# Altium schematic symbol library altera.SCHLIB: 68 symbols (part 1 of 6)
Pins are listed as number, name and electrical type; pins without a type are passive.

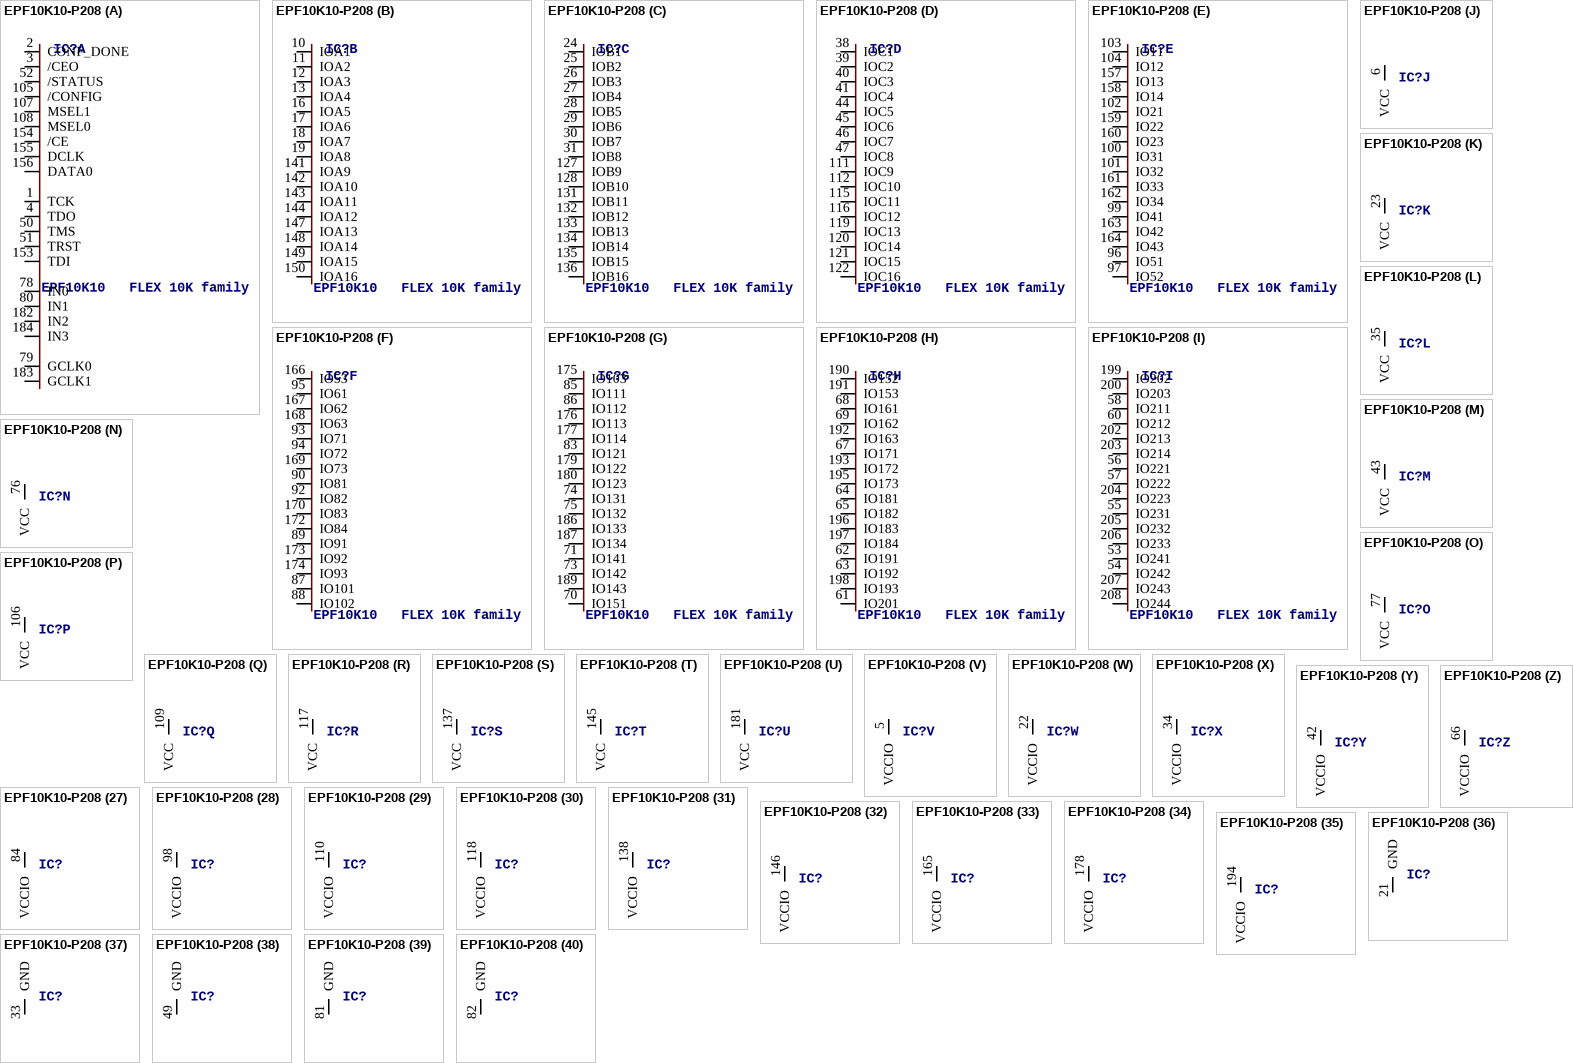
[diagram p0: symbol EPF10K10-P208]

## EPF10K10-P208
designator IC?, comment EPF10K10   FLEX 10K family
MPN: EPF10K10AQC208-3N; OC_FARNELL: 1549381; OC_NEWARK: 51R8749
footprint PQFP208
part A pins: 1 TCK, 2 CONF_DONE, 3 /CEO, 4 TDO, 50 TMS, 51 TRST, 52 /STATUS, 78 IN0, 79 GCLK0, 80 IN1, 105 /CONFIG, 107 MSEL1, 108 MSEL0, 153 TDI, 154 /CE, 155 DCLK, 156 DATA0, 182 IN2, 183 GCLK1, 184 IN3
part B pins: 10 IOA1, 11 IOA2, 12 IOA3, 13 IOA4, 16 IOA5, 17 IOA6, 18 IOA7, 19 IOA8, 141 IOA9, 142 IOA10, 143 IOA11, 144 IOA12, 147 IOA13, 148 IOA14, 149 IOA15, 150 IOA16
part C pins: 24 IOB1, 25 IOB2, 26 IOB3, 27 IOB4, 28 IOB5, 29 IOB6, 30 IOB7, 31 IOB8, 127 IOB9, 128 IOB10, 131 IOB11, 132 IOB12, 133 IOB13, 134 IOB14, 135 IOB15, 136 IOB16
part D pins: 38 IOC1, 39 IOC2, 40 IOC3, 41 IOC4, 44 IOC5, 45 IOC6, 46 IOC7, 47 IOC8, 111 IOC9, 112 IOC10, 115 IOC11, 116 IOC12, 119 IOC13, 120 IOC14, 121 IOC15, 122 IOC16
part E pins: 96 IO51, 97 IO52, 99 IO41, 100 IO31, 101 IO32, 102 IO21, 103 IO11, 104 IO12, 157 IO13, 158 IO14, 159 IO22, 160 IO23, 161 IO33, 162 IO34, 163 IO42, 164 IO43
part F pins: 87 IO101, 88 IO102, 89 IO91, 90 IO81, 92 IO82, 93 IO71, 94 IO72, 95 IO61, 166 IO53, 167 IO62, 168 IO63, 169 IO73, 170 IO83, 172 IO84, 173 IO92, 174 IO93
part G pins: 70 IO151, 71 IO141, 73 IO142, 74 IO131, 75 IO132, 83 IO121, 85 IO111, 86 IO112, 175 IO103, 176 IO113, 177 IO114, 179 IO122, 180 IO123, 186 IO133, 187 IO134, 189 IO143
part H pins: 61 IO201, 62 IO191, 63 IO192, 64 IO181, 65 IO182, 67 IO171, 68 IO161, 69 IO162, 190 IO152, 191 IO153, 192 IO163, 193 IO172, 195 IO173, 196 IO183, 197 IO184, 198 IO193
part I pins: 53 IO241, 54 IO242, 55 IO231, 56 IO221, 57 IO222, 58 IO211, 60 IO212, 199 IO202, 200 IO203, 202 IO213, 203 IO214, 204 IO223, 205 IO232, 206 IO233, 207 IO243, 208 IO244
part J pins: 6 VCC (power)
part K pins: 23 VCC (power)
part L pins: 35 VCC (power)
part M pins: 43 VCC (power)
part N pins: 76 VCC (power)
part O pins: 77 VCC (power)
part P pins: 106 VCC (power)
part Q pins: 109 VCC (power)
part R pins: 117 VCC (power)
part S pins: 137 VCC (power)
part T pins: 145 VCC (power)
part U pins: 181 VCC (power)
part V pins: 5 VCCIO (power)
part W pins: 22 VCCIO (power)
part X pins: 34 VCCIO (power)
part Y pins: 42 VCCIO (power)
part Z pins: 66 VCCIO (power)
part 27 pins: 84 VCCIO (power)
part 28 pins: 98 VCCIO (power)
part 29 pins: 110 VCCIO (power)
part 30 pins: 118 VCCIO (power)
part 31 pins: 138 VCCIO (power)
part 32 pins: 146 VCCIO (power)
part 33 pins: 165 VCCIO (power)
part 34 pins: 178 VCCIO (power)
part 35 pins: 194 VCCIO (power)
part 36 pins: 21 GND (power)
part 37 pins: 33 GND (power)
part 38 pins: 49 GND (power)
part 39 pins: 81 GND (power)
part 40 pins: 82 GND (power)
part 41 pins: 123 GND (power)
part 42 pins: 129 GND (power)
part 43 pins: 151 GND (power)
part 44 pins: 185 GND (power)
part 45 pins: 20 GNDIO (power)
part 46 pins: 32 GNDIO (power)
part 47 pins: 48 GNDIO (power)
part 48 pins: 59 GNDIO (power)
part 49 pins: 72 GNDIO (power)
part 50 pins: 91 GNDIO (power)
part 51 pins: 124 GNDIO (power)
part 52 pins: 130 GNDIO (power)
part 53 pins: 152 GNDIO (power)
part 54 pins: 171 GNDIO (power)
part 55 pins: 188 GNDIO (power)
part 56 pins: 201 GNDIO (power)
part 57 pins: 7 NC
part 58 pins: 8 NC
part 59 pins: 9 NC
part 60 pins: 14 NC
part 61 pins: 15 NC
part 62 pins: 36 NC
part 63 pins: 37 NC
part 64 pins: 113 NC
part 65 pins: 114 NC
part 66 pins: 125 NC
part 67 pins: 126 NC
part 68 pins: 139 NC
part 69 pins: 140 NC

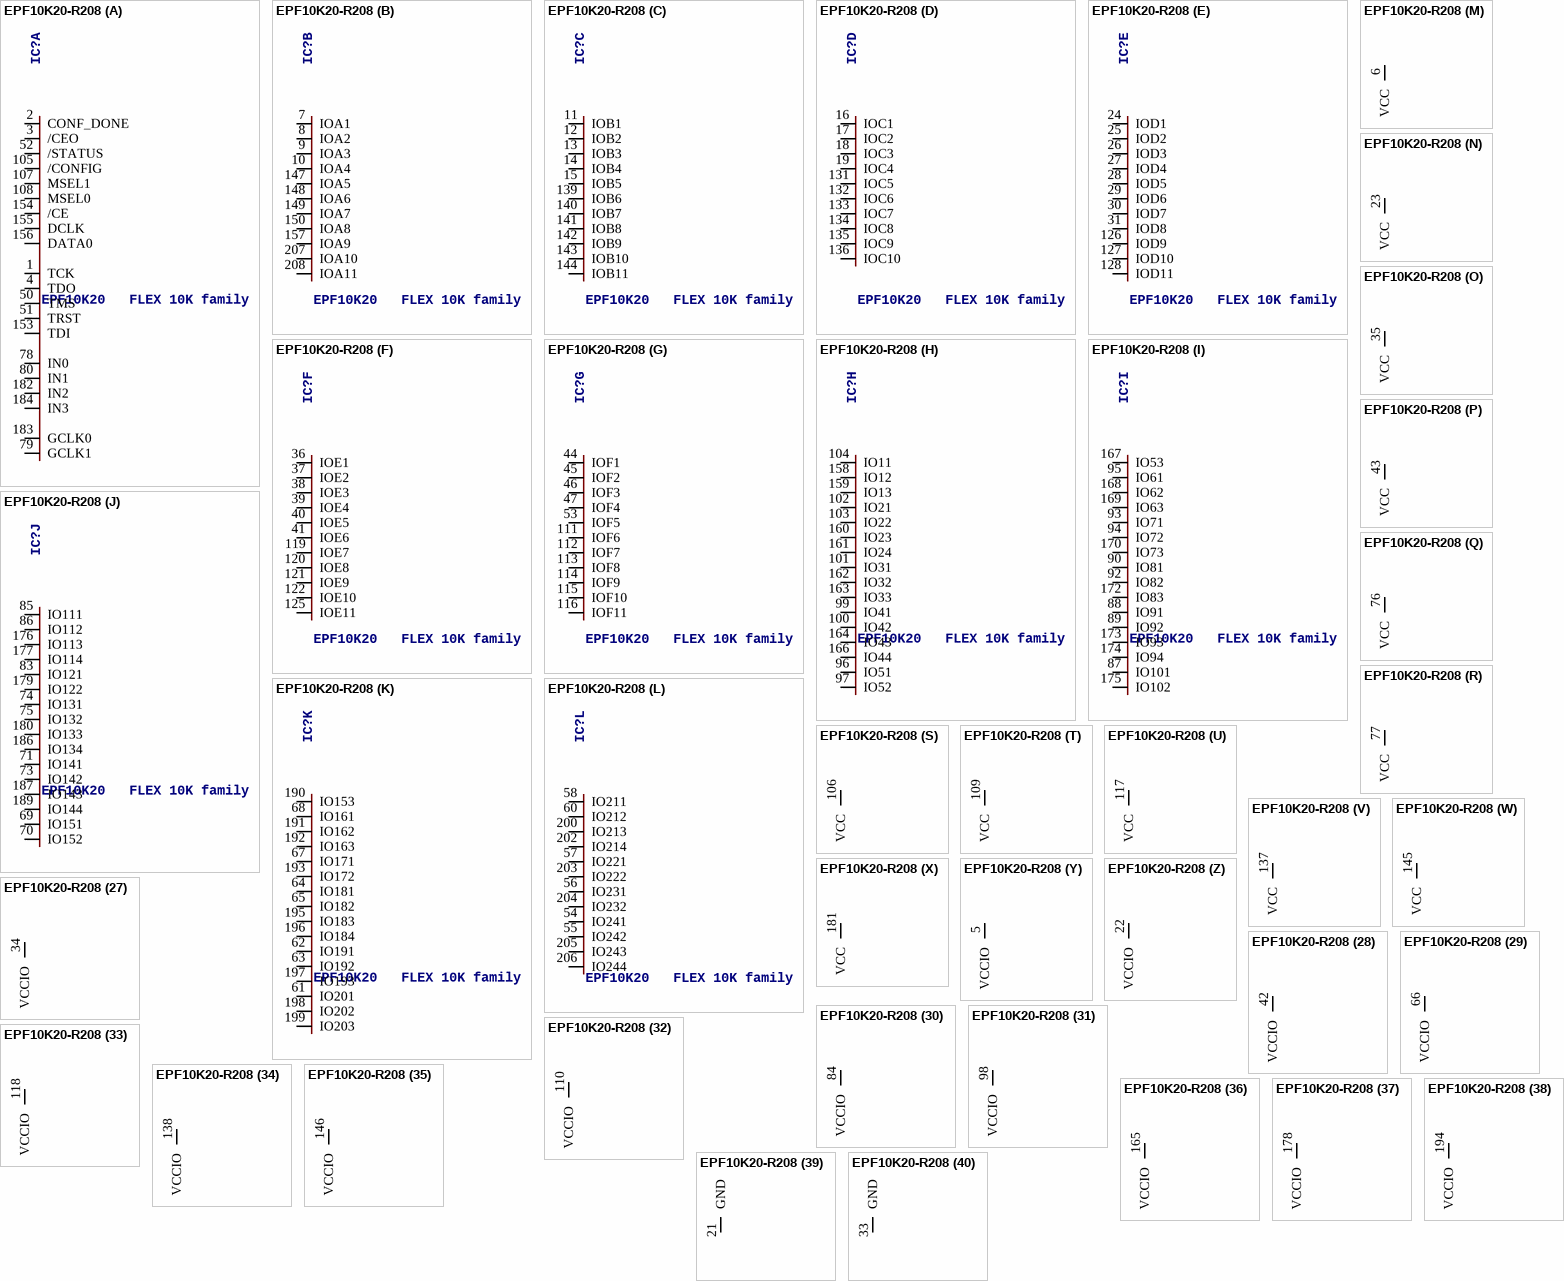
[diagram p1: symbol EPF10K20-R208]

## EPF10K20-R208
designator IC?, comment EPF10K20   FLEX 10K family
MPN: EPF10K20RC208-3N; OC_FARNELL: 1549383; OC_NEWARK: 51R8880
footprint RQFP208
part A pins: 1 TCK, 2 CONF_DONE, 3 /CEO, 4 TDO, 50 TMS, 51 TRST, 52 /STATUS, 78 IN0, 79 GCLK1, 80 IN1, 105 /CONFIG, 107 MSEL1, 108 MSEL0, 153 TDI, 154 /CE, 155 DCLK, 156 DATA0, 182 IN2, 183 GCLK0, 184 IN3
part B pins: 7 IOA1, 8 IOA2, 9 IOA3, 10 IOA4, 147 IOA5, 148 IOA6, 149 IOA7, 150 IOA8, 157 IOA9, 207 IOA10, 208 IOA11
part C pins: 11 IOB1, 12 IOB2, 13 IOB3, 14 IOB4, 15 IOB5, 139 IOB6, 140 IOB7, 141 IOB8, 142 IOB9, 143 IOB10, 144 IOB11
part D pins: 16 IOC1, 17 IOC2, 18 IOC3, 19 IOC4, 131 IOC5, 132 IOC6, 133 IOC7, 134 IOC8, 135 IOC9, 136 IOC10
part E pins: 24 IOD1, 25 IOD2, 26 IOD3, 27 IOD4, 28 IOD5, 29 IOD6, 30 IOD7, 31 IOD8, 126 IOD9, 127 IOD10, 128 IOD11
part F pins: 36 IOE1, 37 IOE2, 38 IOE3, 39 IOE4, 40 IOE5, 41 IOE6, 119 IOE7, 120 IOE8, 121 IOE9, 122 IOE10, 125 IOE11
part G pins: 44 IOF1, 45 IOF2, 46 IOF3, 47 IOF4, 53 IOF5, 111 IOF6, 112 IOF7, 113 IOF8, 114 IOF9, 115 IOF10, 116 IOF11
part H pins: 96 IO51, 97 IO52, 99 IO41, 100 IO42, 101 IO31, 102 IO21, 103 IO22, 104 IO11, 158 IO12, 159 IO13, 160 IO23, 161 IO24, 162 IO32, 163 IO33, 164 IO43, 166 IO44
part I pins: 87 IO101, 88 IO91, 89 IO92, 90 IO81, 92 IO82, 93 IO71, 94 IO72, 95 IO61, 167 IO53, 168 IO62, 169 IO63, 170 IO73, 172 IO83, 173 IO93, 174 IO94, 175 IO102
part J pins: 69 IO151, 70 IO152, 71 IO141, 73 IO142, 74 IO131, 75 IO132, 83 IO121, 85 IO111, 86 IO112, 176 IO113, 177 IO114, 179 IO122, 180 IO133, 186 IO134, 187 IO143, 189 IO144
part K pins: 61 IO201, 62 IO191, 63 IO192, 64 IO181, 65 IO182, 67 IO171, 68 IO161, 190 IO153, 191 IO162, 192 IO163, 193 IO172, 195 IO183, 196 IO184, 197 IO193, 198 IO202, 199 IO203
part L pins: 54 IO241, 55 IO242, 56 IO231, 57 IO221, 58 IO211, 60 IO212, 200 IO213, 202 IO214, 203 IO222, 204 IO232, 205 IO243, 206 IO244
part M pins: 6 VCC (power)
part N pins: 23 VCC (power)
part O pins: 35 VCC (power)
part P pins: 43 VCC (power)
part Q pins: 76 VCC (power)
part R pins: 77 VCC (power)
part S pins: 106 VCC (power)
part T pins: 109 VCC (power)
part U pins: 117 VCC (power)
part V pins: 137 VCC (power)
part W pins: 145 VCC (power)
part X pins: 181 VCC (power)
part Y pins: 5 VCCIO (power)
part Z pins: 22 VCCIO (power)
part 27 pins: 34 VCCIO (power)
part 28 pins: 42 VCCIO (power)
part 29 pins: 66 VCCIO (power)
part 30 pins: 84 VCCIO (power)
part 31 pins: 98 VCCIO (power)
part 32 pins: 110 VCCIO (power)
part 33 pins: 118 VCCIO (power)
part 34 pins: 138 VCCIO (power)
part 35 pins: 146 VCCIO (power)
part 36 pins: 165 VCCIO (power)
part 37 pins: 178 VCCIO (power)
part 38 pins: 194 VCCIO (power)
part 39 pins: 21 GND (power)
part 40 pins: 33 GND (power)
part 41 pins: 49 GND (power)
part 42 pins: 81 GND (power)
part 43 pins: 82 GND (power)
part 44 pins: 123 GND (power)
part 45 pins: 129 GND (power)
part 46 pins: 151 GND (power)
part 47 pins: 185 GND (power)
part 48 pins: 20 GNDIO (power)
part 49 pins: 32 GNDIO (power)
part 50 pins: 48 GNDIO (power)
part 51 pins: 59 GNDIO (power)
part 52 pins: 72 GNDIO (power)
part 53 pins: 91 GNDIO (power)
part 54 pins: 124 GNDIO (power)
part 55 pins: 130 GNDIO (power)
part 56 pins: 152 GNDIO (power)
part 57 pins: 171 GNDIO (power)
part 58 pins: 188 GNDIO (power)
part 59 pins: 201 GNDIO (power)

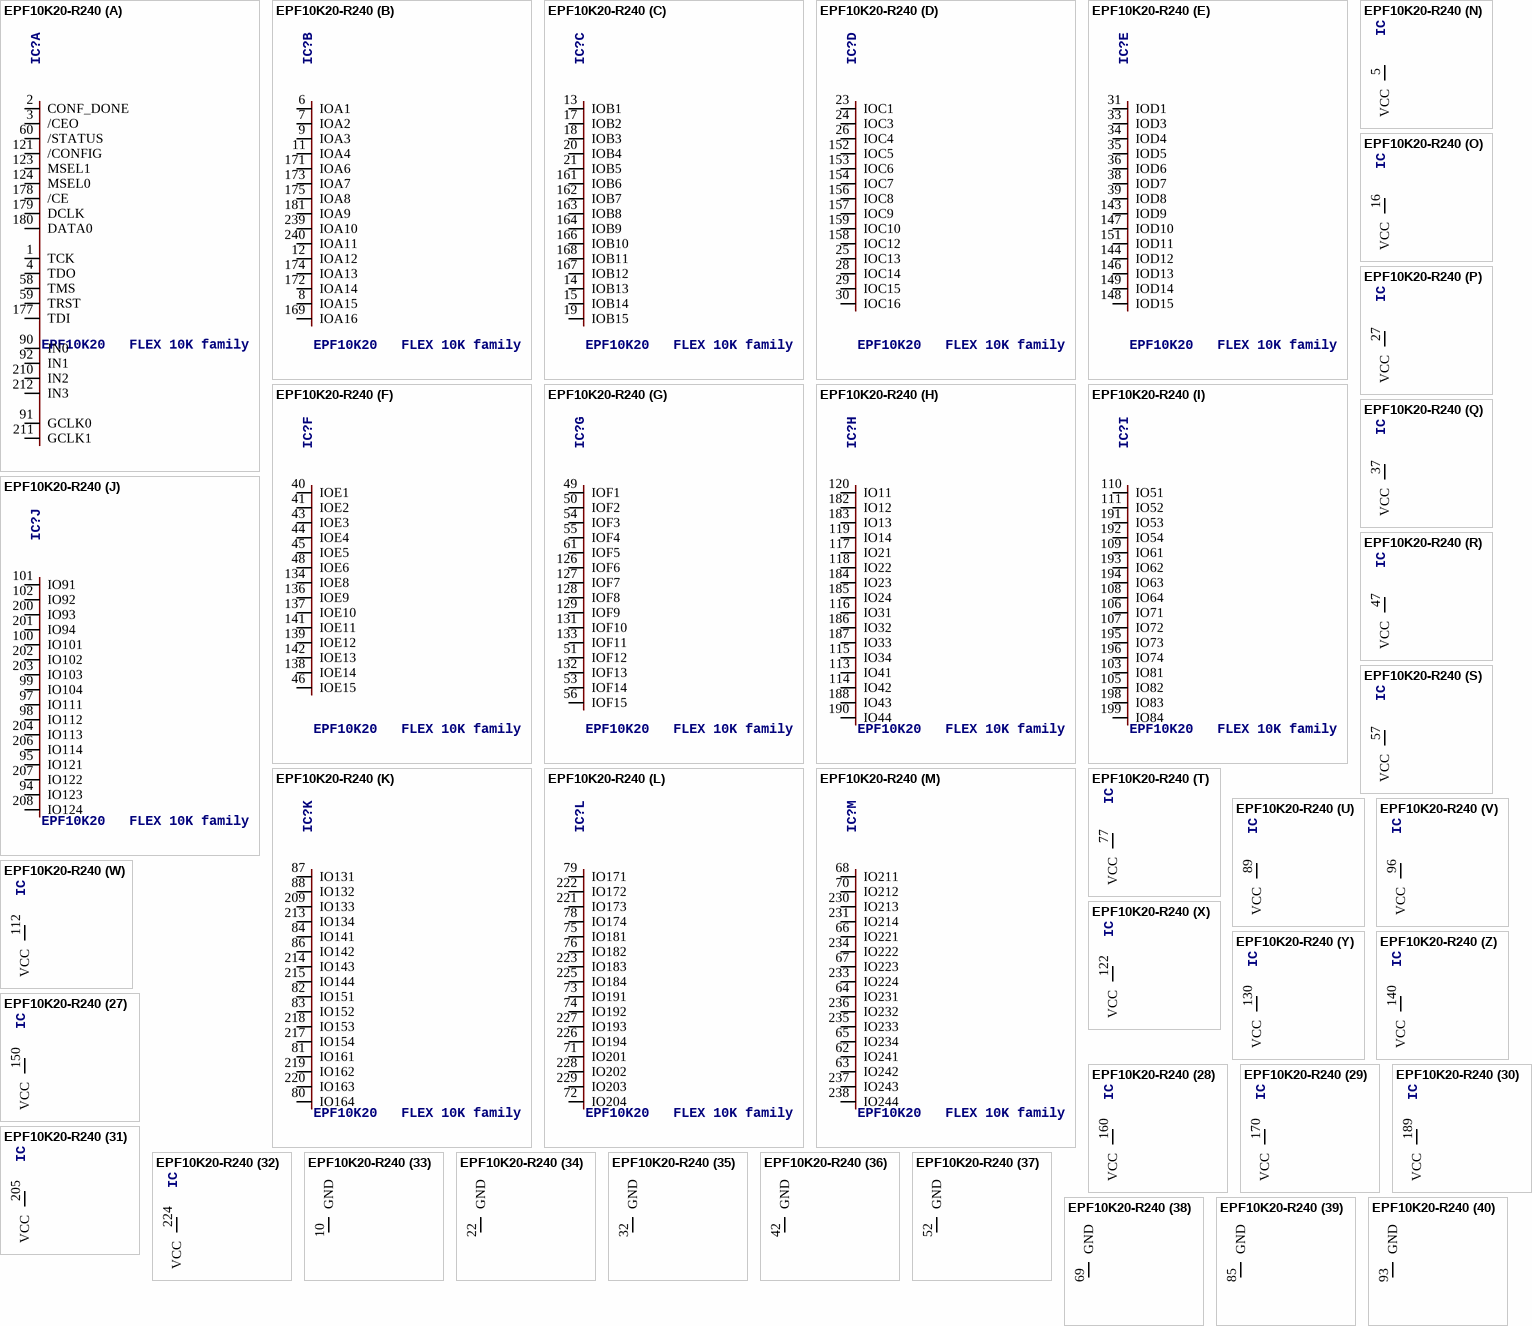
[diagram p2: symbol EPF10K20-R240]

## EPF10K20-R240
designator IC?, comment EPF10K20   FLEX 10K family
MPN: EPF10K20RC240-3N; OC_FARNELL: unknown; OC_NEWARK: 51R8884
footprint RQFP240
part A pins: 1 TCK, 2 CONF_DONE, 3 /CEO, 4 TDO, 58 TMS, 59 TRST, 60 /STATUS, 90 IN0, 91 GCLK0, 92 IN1, 121 /CONFIG, 123 MSEL1, 124 MSEL0, 177 TDI, 178 /CE, 179 DCLK, 180 DATA0, 210 IN2, 211 GCLK1, 212 IN3
part B pins: 6 IOA1, 7 IOA2, 8 IOA15, 9 IOA3, 11 IOA4, 12 IOA12, 169 IOA16, 171 IOA6, 172 IOA14, 173 IOA7, 174 IOA13, 175 IOA8, 181 IOA9, 239 IOA10, 240 IOA11
part C pins: 13 IOB1, 14 IOB13, 15 IOB14, 17 IOB2, 18 IOB3, 19 IOB15, 20 IOB4, 21 IOB5, 161 IOB6, 162 IOB7, 163 IOB8, 164 IOB9, 166 IOB10, 167 IOB12, 168 IOB11
part D pins: 23 IOC1, 24 IOC3, 25 IOC13, 26 IOC4, 28 IOC14, 29 IOC15, 30 IOC16, 152 IOC5, 153 IOC6, 154 IOC7, 156 IOC8, 157 IOC9, 158 IOC12, 159 IOC10
part E pins: 31 IOD1, 33 IOD3, 34 IOD4, 35 IOD5, 36 IOD6, 38 IOD7, 39 IOD8, 143 IOD9, 144 IOD12, 146 IOD13, 147 IOD10, 148 IOD15, 149 IOD14, 151 IOD11
part F pins: 40 IOE1, 41 IOE2, 43 IOE3, 44 IOE4, 45 IOE5, 46 IOE15, 48 IOE6, 134 IOE8, 136 IOE9, 137 IOE10, 138 IOE14, 139 IOE12, 141 IOE11, 142 IOE13
part G pins: 49 IOF1, 50 IOF2, 51 IOF12, 53 IOF14, 54 IOF3, 55 IOF4, 56 IOF15, 61 IOF5, 126 IOF6, 127 IOF7, 128 IOF8, 129 IOF9, 131 IOF10, 132 IOF13, 133 IOF11
part H pins: 113 IO41, 114 IO42, 115 IO34, 116 IO31, 117 IO21, 118 IO22, 119 IO14, 120 IO11, 182 IO12, 183 IO13, 184 IO23, 185 IO24, 186 IO32, 187 IO33, 188 IO43, 190 IO44
part I pins: 103 IO81, 105 IO82, 106 IO71, 107 IO72, 108 IO64, 109 IO61, 110 IO51, 111 IO52, 191 IO53, 192 IO54, 193 IO62, 194 IO63, 195 IO73, 196 IO74, 198 IO83, 199 IO84
part J pins: 94 IO123, 95 IO121, 97 IO111, 98 IO112, 99 IO104, 100 IO101, 101 IO91, 102 IO92, 200 IO93, 201 IO94, 202 IO102, 203 IO103, 204 IO113, 206 IO114, 207 IO122, 208 IO124
part K pins: 80 IO164, 81 IO161, 82 IO151, 83 IO152, 84 IO141, 86 IO142, 87 IO131, 88 IO132, 209 IO133, 213 IO134, 214 IO143, 215 IO144, 217 IO154, 218 IO153, 219 IO162, 220 IO163
part L pins: 71 IO201, 72 IO204, 73 IO191, 74 IO192, 75 IO181, 76 IO182, 78 IO174, 79 IO171, 221 IO173, 222 IO172, 223 IO183, 225 IO184, 226 IO194, 227 IO193, 228 IO202, 229 IO203
part M pins: 62 IO241, 63 IO242, 64 IO231, 65 IO234, 66 IO221, 67 IO223, 68 IO211, 70 IO212, 230 IO213, 231 IO214, 233 IO224, 234 IO222, 235 IO233, 236 IO232, 237 IO243, 238 IO244
part N pins: 5 VCC (power)
part O pins: 16 VCC (power)
part P pins: 27 VCC (power)
part Q pins: 37 VCC (power)
part R pins: 47 VCC (power)
part S pins: 57 VCC (power)
part T pins: 77 VCC (power)
part U pins: 89 VCC (power)
part V pins: 96 VCC (power)
part W pins: 112 VCC (power)
part X pins: 122 VCC (power)
part Y pins: 130 VCC (power)
part Z pins: 140 VCC (power)
part 27 pins: 150 VCC (power)
part 28 pins: 160 VCC (power)
part 29 pins: 170 VCC (power)
part 30 pins: 189 VCC (power)
part 31 pins: 205 VCC (power)
part 32 pins: 224 VCC (power)
part 33 pins: 10 GND (power)
part 34 pins: 22 GND (power)
part 35 pins: 32 GND (power)
part 36 pins: 42 GND (power)
part 37 pins: 52 GND (power)
part 38 pins: 69 GND (power)
part 39 pins: 85 GND (power)
part 40 pins: 93 GND (power)
part 41 pins: 104 GND (power)
part 42 pins: 125 GND (power)
part 43 pins: 135 GND (power)
part 44 pins: 145 GND (power)
part 45 pins: 155 GND (power)
part 46 pins: 165 GND (power)
part 47 pins: 176 GND (power)
part 48 pins: 197 GND (power)
part 49 pins: 216 GND (power)
part 50 pins: 232 GND (power)

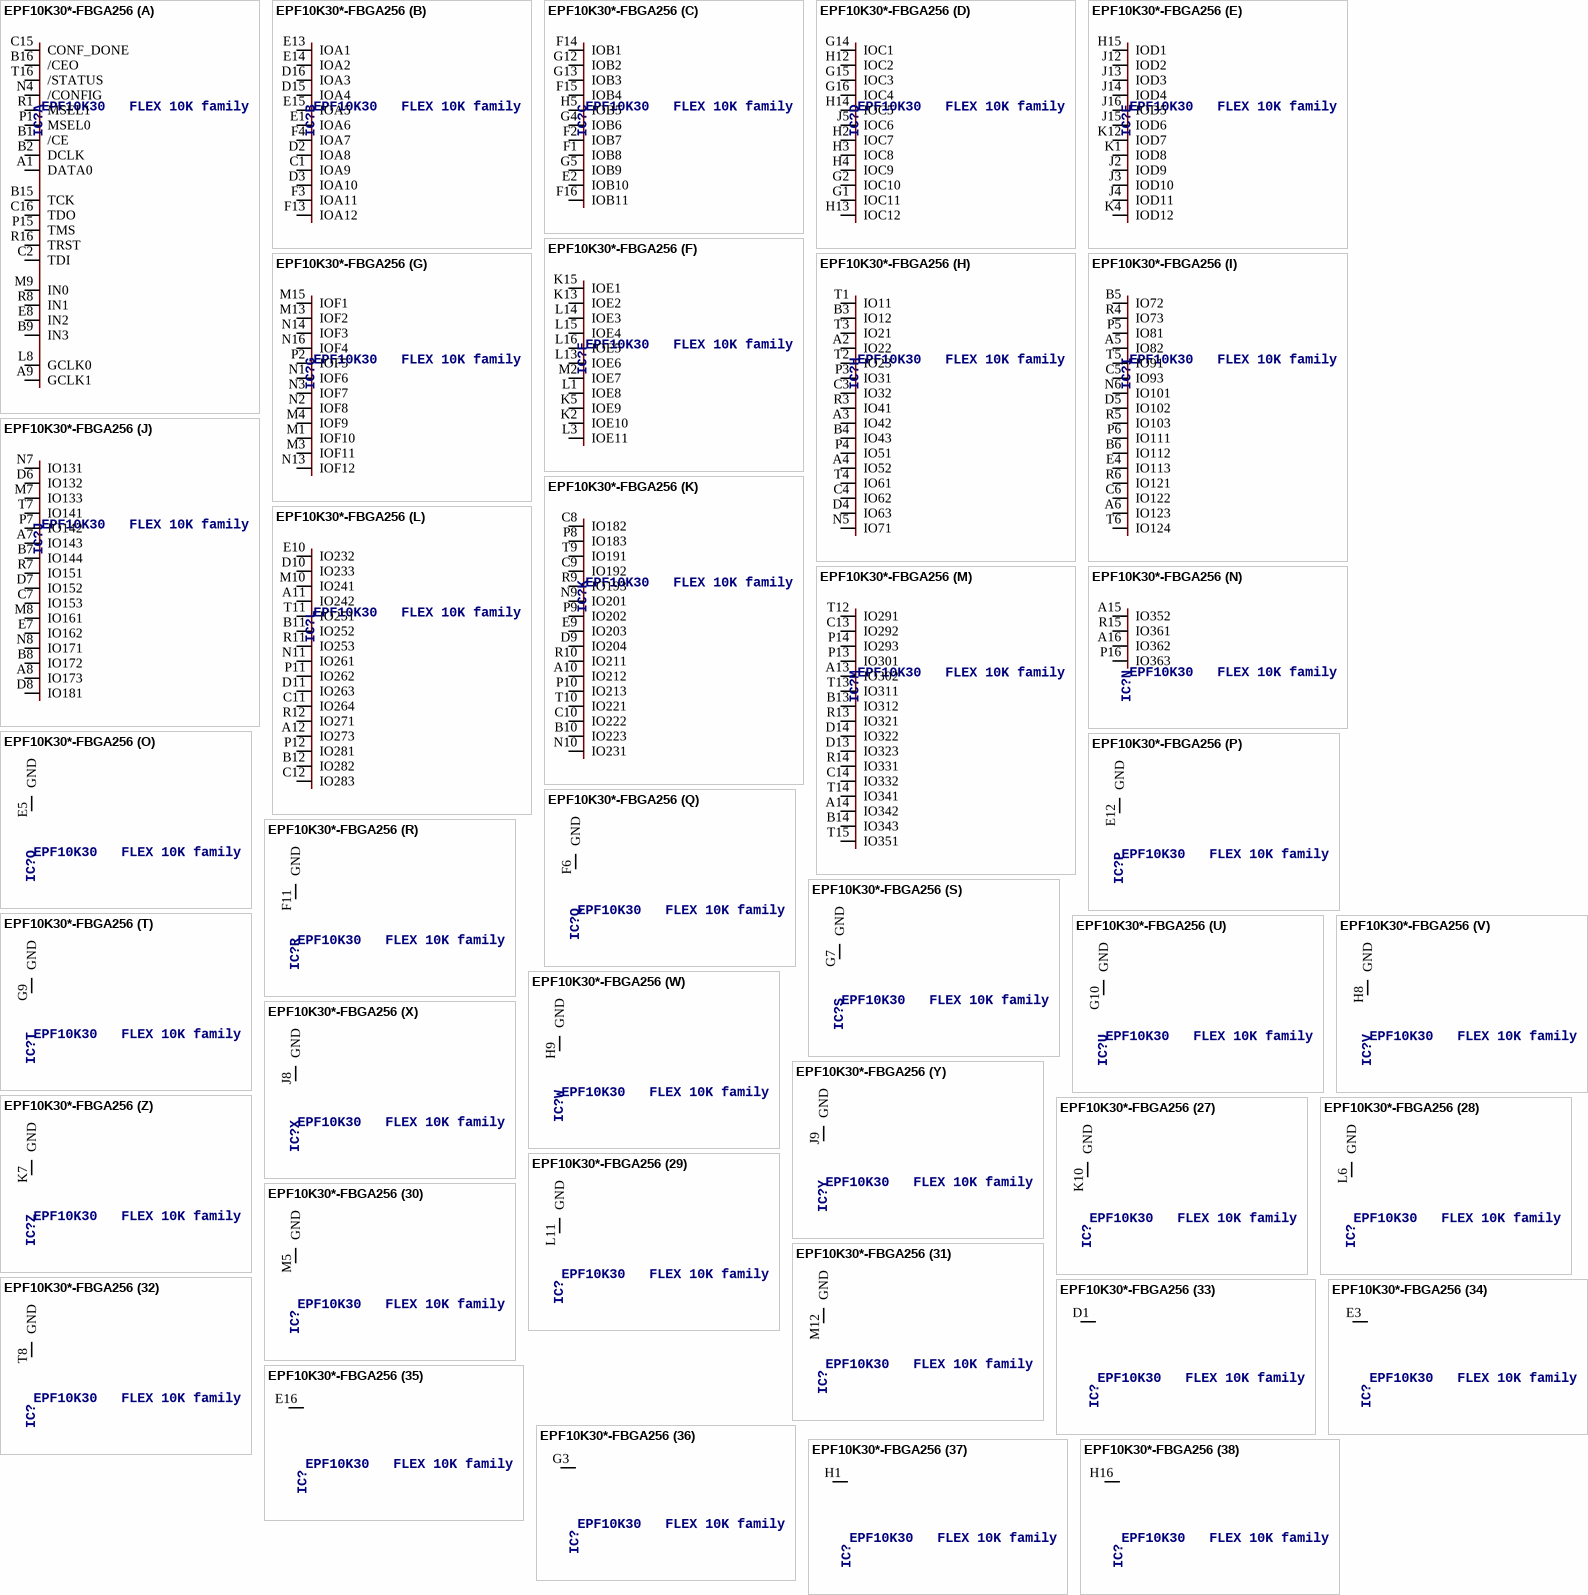
[diagram p3: symbol EPF10K30*-FBGA256]

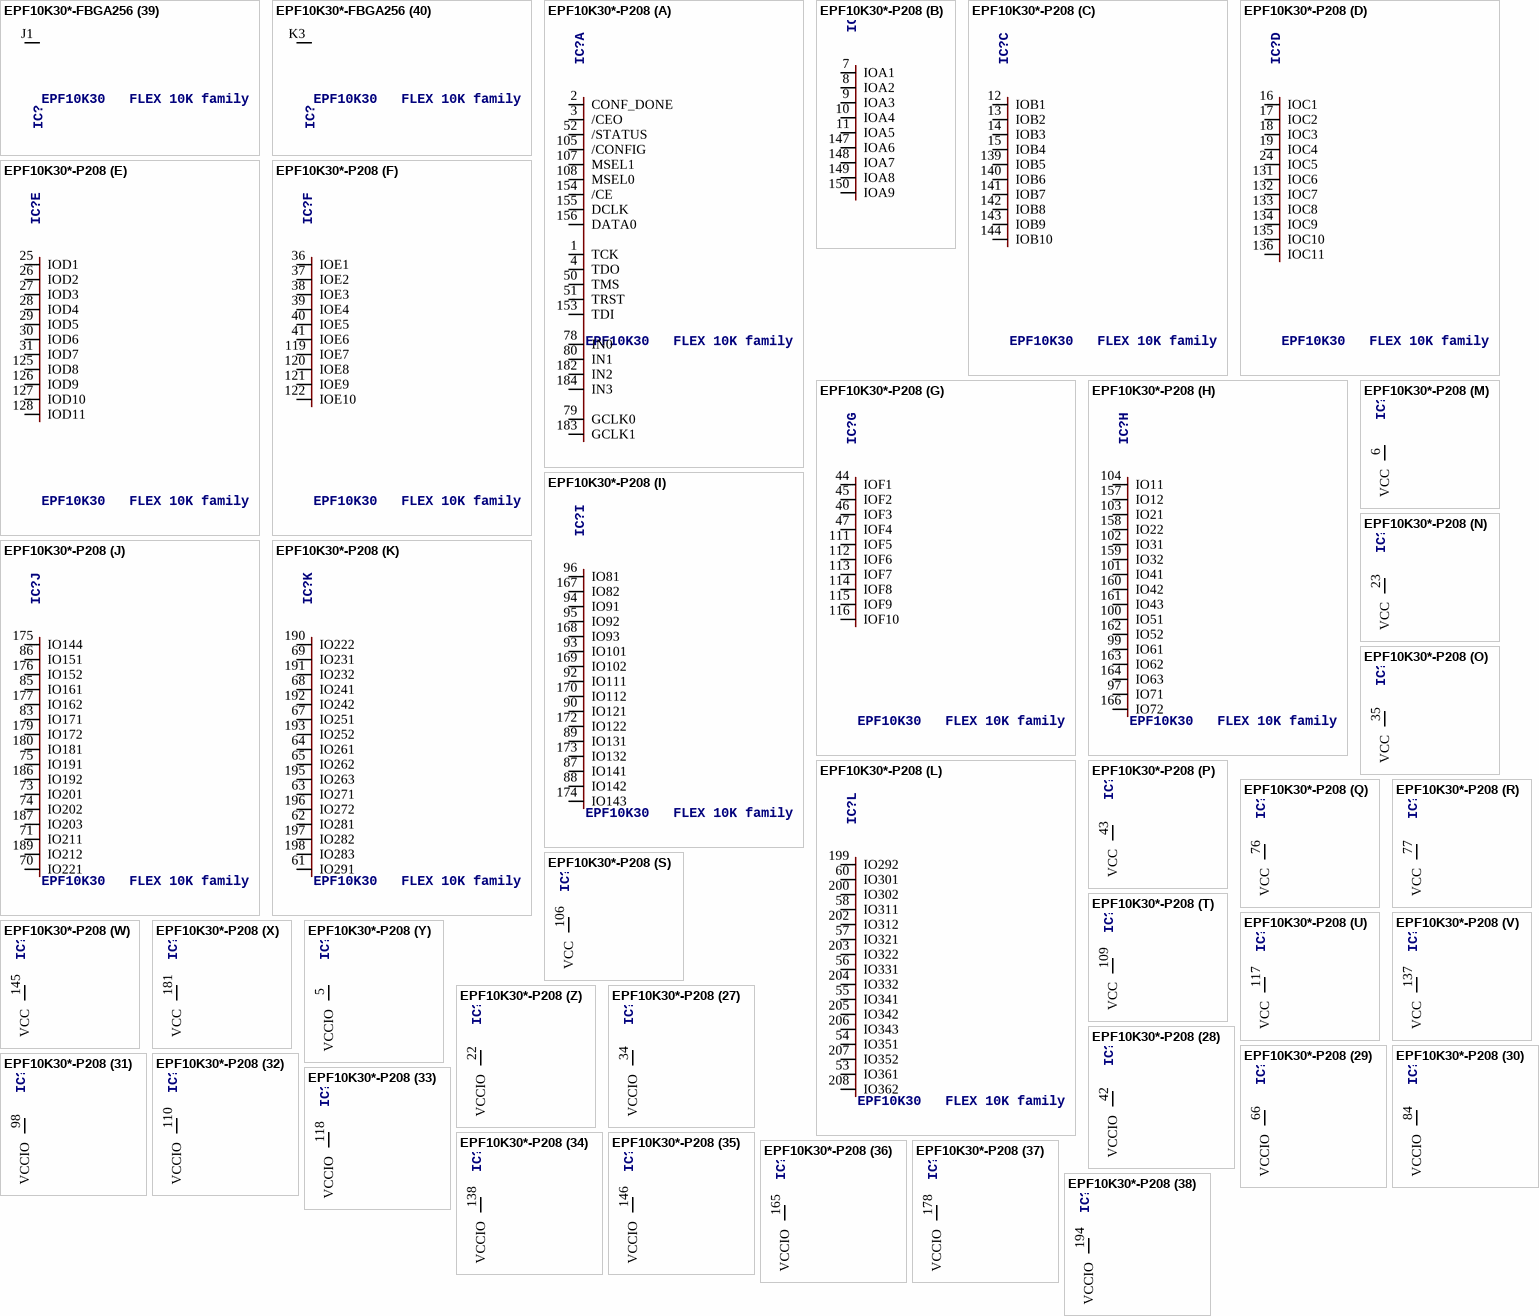
[diagram p4: symbols EPF10K30*-FBGA256 to EPF10K30*-P208]
